# Altium footprint library RNG_Footprints.PcbLib: 134 footprints (part 5 of 9)
Each footprint in its own frame and in the unit in brackets; x right, y up, seen from the top. Pads: shape width x height; smd on the part's side, far side on the other; paste and mask are expansions set on the pad; w line width, h text height; cw(c..) or ccw(c..) is an arc to the next point about the centre after c.
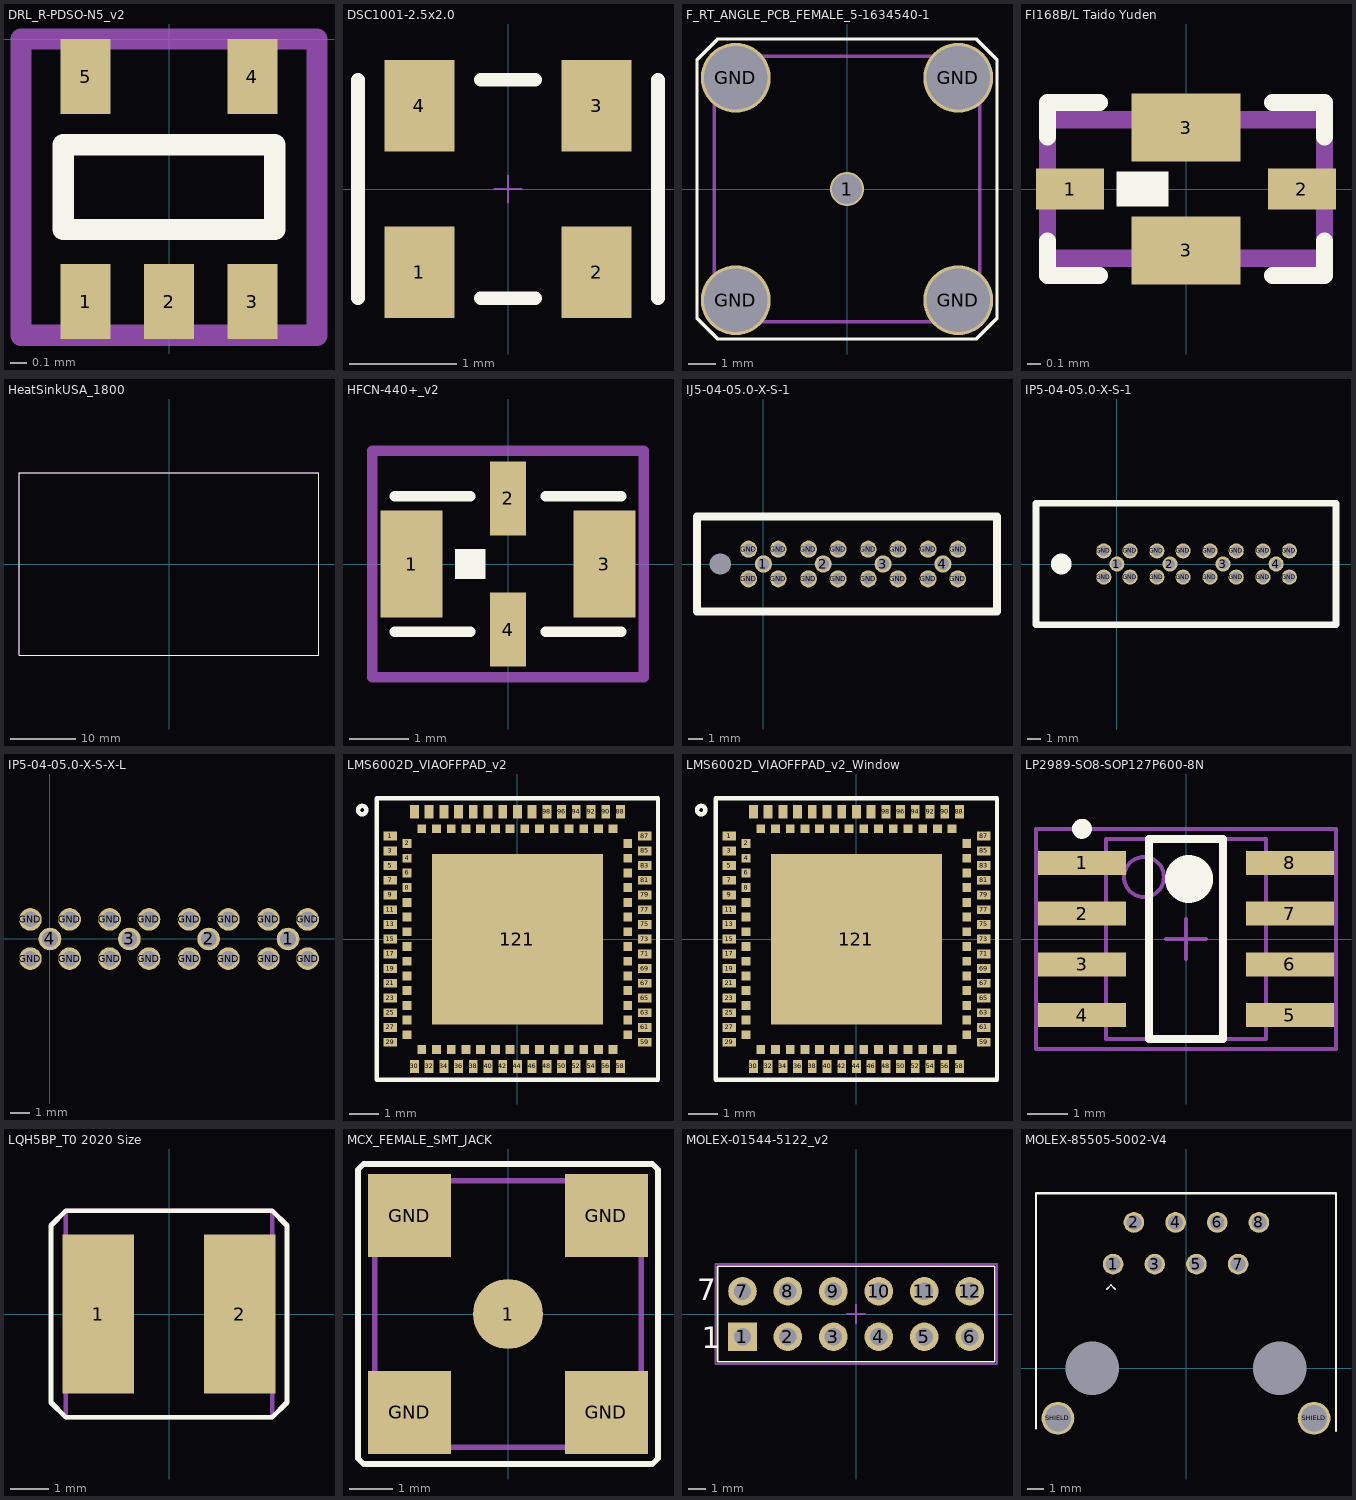
[diagram p4: the footprints below, top view; thin cyan lines are the x and y axes]

## DRL_R-PDSO-N5_v2 [mm] "SN74AUP1G06DRLR_SOT_Inverter"
height 0.6
pads (5):
  rect 0.3x0.45 smd mask+0.05: 1(-0.5,-1.575) 2(0,-1.575) 3(0.5,-1.575) 4(0.5,-0.225) 5(-0.5,-0.225)
Top Overlay:
  lines w0.127: -0.635,-1.143 -0.635,-0.635 0.635,-0.635 0.635,-1.143 -0.635,-1.143
  text "." at -0.889,-1.397 h0.5
Mechanical 15:
  lines w0.127: -0.889,-1.778 -0.889,0 0.889,0 0.889,-1.778 -0.889,-1.778
3D body: height 0.6, standoff 0, extent -0.85,-1.5 0.85,-0.2

## DSC1001-2.5x2.0 [mm] "Discera Low-Power Precision Oscillator 2.5x2.0 mm"
height 0.9
pads (4):
  rect 0.65x0.85 smd: 1(-0.825,-0.775) 2(0.825,-0.775) 3(0.825,0.775) 4(-0.825,0.775)
Top Overlay:
  lines w0.127: -1.397,-1.016 -1.397,1.016 ; -0.254,-1.016 0.254,-1.016 ; -0.254,1.016 0.254,1.016 ; 1.397,-1.016 1.397,1.016
  text "." at -1.27,-1.778 h1
Mechanical 15:
  lines w0.02: -0.127,0 0.127,0 ; 0,-0.127 0,0.127
3D body "User Library-VCXO 2_5x2_0.STEP": height 0.72, standoff 0.01, extent -1.25,-1 1.25,1

## F_RT_ANGLE_PCB_FEMALE_5-1634540-1 [mm] "TE Connectivity 5-1634540-1 F-Type PCB Female Rt-Angle Mount"
height 16
pads (5):
  round 1.245 hole 1.1 mask+0.05: 1(0,0)
  round 2.54 hole 2.3 mask+0.05: GND(-4.05,-4.05) GND(-4.05,4.05) GND(4.05,-4.05) GND(4.05,4.05)
Top Overlay:
  lines w0.127: -5.461,-4.699 -4.699,-5.461 4.699,-5.461 5.461,-4.699 5.461,4.699 4.699,5.461 -4.699,5.461 -5.461,4.699 -5.461,4.445 -5.461,-4.699
Mechanical 15:
  lines w0.127: -4.826,-4.826 -4.826,4.826 4.826,4.826 4.826,-4.826 -4.826,-4.826
3D body: height 13.1, standoff 0, extent -4.75,-4.75 4.75,4.75
3D body: height 12.31, standoff 2.85, extent 4.75,-4.741 23.25,4.741

## FI168B/L Taido Yuden [mm] "Taido Yuden Band- and Low-Pass Ceramic Filter for FI168 Type"
height 0.5
pads (4):
  rect 0.5x0.3 smd mask+0.038: 1(-0.85,0) 2(0.85,0)
  rect 0.8x0.5 smd mask+0.038: 3(0,-0.45) 3(0,0.45)
Top Overlay:
  rectangle: -0.508,-0.127 -0.127,0.127
  lines w0.127: -1.016,-0.381 -1.016,-0.635 -0.635,-0.635 ; -1.016,0.381 -1.016,0.635 -0.635,0.635 ; 0.635,-0.635 1.016,-0.635 1.016,-0.381 ; 0.635,0.635 1.016,0.635 1.016,0.381
Mechanical 15:
  lines w0.127: -1.016,-0.508 1.016,-0.508 1.016,0.508 -1.016,0.508 -1.016,-0.508
3D body: height 0.5, standoff 0, extent -0.85,-0.45 0.85,0.45

## HeatSinkUSA_1800 [mm] "HeatSinkUSA 1.8\" Heat Sink"
height 31.75
Top Overlay:
  lines w0.127: -23.114,-14.097 23.114,-14.097 23.114,14.097 -23.114,14.097 -23.114,-14.097
Mechanical 15:
  lines w0.127: -23.114,-14.097 23.114,-14.097 23.114,14.097 -23.114,14.097 -23.114,-14.097
3D body: height 31.75, standoff 0, extent -23.025,-13.97 23.025,13.97

## HFCN-440+_v2 [mil] "Mini-Circuits High-Pass 500-2500 MHz SMT High-Pass Filter"
height 37
pads (4):
  rect 41x71 smd: 1(-64,0) 3(64,0)
  rect 24x49 smd: 2(0,43.5) 4(0,-43.5)
Top Overlay:
  rectangle: -35,-10 -15,10
  lines w7: -75,-45 -25,-45 ; -75,45 -25,45 ; 25,-45 75,-45 ; 25,45 75,45
Mechanical 15:
  lines w7: -90,-75 90,-75 90,75 -90,75 -90,-75
3D body: height 37, standoff 0, extent -63,-31.5 63,31.5

## IJ5-04-05.0-X-S-1 [mil] "Samtec IJ5 50 Ohm High-Isolation RF Jack, 4-POS, Single Row"
height 296.06
pads (21):
  round 45 hole 31: 1(0,0) 2(157.5,0) 3(315,0) 4(472.5,0) GND(-39,-39) GND(-39,39) GND(39,-39) GND(39,39) GND(118.5,-39) GND(118.5,39) GND(196.5,-39) GND(196.5,39) GND(276,-39) GND(276,39) GND(354,-39) GND(354,39) GND(433.5,-39) GND(433.5,39) GND(511.5,-39) GND(511.5,39)
  round 0 hole 56 unplated: ""(-114,0)
Top Overlay:
  lines w20: -175,-125 -175,125 615,125 615,-125 -175,-125
3D body "IJ5-04-05.0-X-S-1.step": height 238.78, standoff -59.52, extent -163.99,-113.04 601.51,113.06

## IP5-04-05.0-X-S-1 [mil] "Samtec IP5 50 Ohm High Isolation RF Plugs, 4 Pos, Single Row"
height 358.1
pads (20):
  round 45 hole 31: 1(0,0) 2(157.5,0) 3(315,0) 4(472.5,0) GND(-39,-39) GND(-39,39) GND(39,-39) GND(39,39) GND(118.5,-39) GND(118.5,39) GND(196.5,-39) GND(196.5,39) GND(276,-39) GND(276,39) GND(354,-39) GND(354,39) GND(433.5,-39) GND(433.5,39) GND(511.5,-39) GND(511.5,39)
Top Overlay:
  circle w39.37: c-165,0 r11.18
  lines w20: -240,-180 650,-180 650,180 -240,180 -240,-180
3D body "IP5-04-05.0-X-S-1.step": height 358.78, standoff -59.52, extent -225,-168 635,168.05

## IP5-04-05.0-X-S-X-L [mil] "Samtec IP5 50 Ohm High Isolation RF Plugs, 4 Pos, Single Row, w/ Latch"
height 358.1
pads (20):
  round 45 hole 31: 1(472.5,0) 2(315,0) 3(157.5,0) 4(0,0) GND(-39,-39) GND(-39,39) GND(39,-39) GND(39,39) GND(118.5,-39) GND(118.5,39) GND(196.5,-39) GND(196.5,39) GND(276,-39) GND(276,39) GND(354,-39) GND(354,39) GND(433.5,-39) GND(433.5,39) GND(511.5,-39) GND(511.5,39)
3D body "IP5-04-05.0-X-S-X-L.step": height 358.78, standoff -61.53, extent -378.75,-168.05 791.25,168.05

## LMS6002D_VIAOFFPAD_v2 [mm] "Lime Microsystems Wideband Transceiver 300-3800MHz"
height 0.6
pads (117):
  rect 0.45x0.3 smd mask+0.05: 1(-4.325,3.5) 3(-4.325,3) 5(-4.325,2.5) 7(-4.325,2) 9(-4.325,1.5) 11(-4.325,1) 13(-4.325,0.5) 15(-4.325,0) 17(-4.325,-0.5) 19(-4.325,-1) 21(-4.325,-1.5) 23(-4.325,-2) 25(-4.325,-2.5) 27(-4.325,-3) 29(-4.325,-3.5) 59(4.325,-3.5) 61(4.325,-3) 63(4.325,-2.5) 65(4.325,-2) 67(4.325,-1.5) 69(4.325,-1) 71(4.325,-0.5) 73(4.325,0) 75(4.325,0.5) 77(4.325,1) 79(4.325,1.5) 81(4.325,2) 83(4.325,2.5) 85(4.325,3) 87(4.325,3.5)
  rect 0.3x0.3 smd mask+0.05: 2(-3.75,3.25) 4(-3.75,2.75) 6(-3.75,2.25) 8(-3.75,1.75) 10(-3.75,1.25) 12(-3.75,0.75) 14(-3.75,0.25) 16(-3.75,-0.25) 18(-3.75,-0.75) 20(-3.75,-1.25) 22(-3.75,-1.75) 24(-3.75,-2.25) 26(-3.75,-2.75) 28(-3.75,-3.25) 31(-3.25,-3.75) 33(-2.75,-3.75) 35(-2.25,-3.75) 37(-1.75,-3.75) 39(-1.25,-3.75) 41(-0.75,-3.75) 43(-0.25,-3.75) 45(0.25,-3.75) 47(0.75,-3.75) 49(1.25,-3.75) 51(1.75,-3.75) 53(2.25,-3.75) 55(2.75,-3.75) 57(3.25,-3.75) 60(3.75,-3.25) 62(3.75,-2.75) 64(3.75,-2.25) 66(3.75,-1.75) 68(3.75,-1.25) 70(3.75,-0.75) 72(3.75,-0.25) 74(3.75,0.25) 76(3.75,0.75) 78(3.75,1.25) 80(3.75,1.75) 82(3.75,2.25) 84(3.75,2.75) 86(3.75,3.25) 89(3.25,3.75) 91(2.75,3.75) 93(2.25,3.75) 95(1.75,3.75) 97(1.25,3.75) 99(0.75,3.75) 101(0.25,3.75) 103(-0.25,3.75) 105(-0.75,3.75) 107(-1.25,3.75) 109(-1.75,3.75) 111(-2.25,3.75) 113(-2.75,3.75) 115(-3.25,3.75)
  rect 0.3x0.45 smd mask+0.05: 30(-3.5,-4.325) 32(-3,-4.325) 34(-2.5,-4.325) 36(-2,-4.325) 38(-1.5,-4.325) 40(-1,-4.325) 42(-0.5,-4.325) 44(0,-4.325) 46(0.5,-4.325) 48(1,-4.325) 50(1.5,-4.325) 52(2,-4.325) 54(2.5,-4.325) 56(3,-4.325) 58(3.5,-4.325) 88(3.5,4.325) 90(3,4.325) 92(2.5,4.325) 94(2,4.325) 96(1.5,4.325) 98(1,4.325) 100(0.5,4.325) 102(0,4.325) 104(-0.5,4.325) 106(-1,4.325) 108(-1.5,4.325) 110(-2,4.325) 112(-2.5,4.325) 114(-3,4.325) 116(-3.5,4.325)
  rect 5.8x5.8 smd paste-6.8 mask+0.05: 121(0,0)
Top Overlay:
  circle w0.15: c-5.275,4.385 r0.141
  lines w0.15: -4.775,-4.775 4.775,-4.775 4.775,4.785 -4.775,4.785 -4.775,-4.775
Top Paste:
  rectangle: -2.735,-2.6 -2.435,-1.9
  rectangle: -2.265,-2.6 -1.965,-1.9
  rectangle: -1.795,-2.6 -1.495,-1.9
  rectangle: -1.325,-2.6 -1.025,-1.9
  rectangle: -0.855,-2.6 -0.555,-1.9
  rectangle: -0.385,-2.6 -0.085,-1.9
  rectangle: 0.085,-2.6 0.385,-1.9
  rectangle: 0.555,-2.6 0.855,-1.9
  rectangle: 1.025,-2.6 1.325,-1.9
  rectangle: 1.495,-2.6 1.795,-1.9
  rectangle: 1.965,-2.6 2.265,-1.9
  rectangle: 2.435,-2.6 2.735,-1.9
  rectangle: 2.435,-2.6 2.735,-1.9
  rectangle: 1.965,-2.6 2.265,-1.9
  rectangle: 1.495,-2.6 1.795,-1.9
  rectangle: 1.025,-2.6 1.325,-1.9
  rectangle: 0.555,-2.6 0.855,-1.9
  rectangle: 0.085,-2.6 0.385,-1.9
  rectangle: -0.385,-2.6 -0.085,-1.9
  rectangle: -0.855,-2.6 -0.555,-1.9
  rectangle: -1.325,-2.6 -1.025,-1.9
  rectangle: -1.795,-2.6 -1.495,-1.9
  rectangle: -2.265,-2.6 -1.965,-1.9
  rectangle: -2.735,-2.6 -2.435,-1.9
  rectangle: 2.435,-1.7 2.735,-1
  rectangle: 1.965,-1.7 2.265,-1
  rectangle: 1.495,-1.7 1.795,-1
  rectangle: 1.025,-1.7 1.325,-1
  rectangle: 0.555,-1.7 0.855,-1
  rectangle: 0.085,-1.7 0.385,-1
  rectangle: -0.385,-1.7 -0.085,-1
  rectangle: -0.855,-1.7 -0.555,-1
  rectangle: -1.325,-1.7 -1.025,-1
  rectangle: -1.795,-1.7 -1.495,-1
  rectangle: -2.265,-1.7 -1.965,-1
  rectangle: -2.735,-1.7 -2.435,-1
  rectangle: 2.435,-0.8 2.735,-0.1
  rectangle: 1.965,-0.8 2.265,-0.1
  rectangle: 1.495,-0.8 1.795,-0.1
  rectangle: 1.025,-0.8 1.325,-0.1
  rectangle: 0.555,-0.8 0.855,-0.1
  rectangle: 0.085,-0.8 0.385,-0.1
  rectangle: -0.385,-0.8 -0.085,-0.1
  rectangle: -0.855,-0.8 -0.555,-0.1
  rectangle: -1.325,-0.8 -1.025,-0.1
  rectangle: -1.795,-0.8 -1.495,-0.1
  rectangle: -2.265,-0.8 -1.965,-0.1
  rectangle: -2.735,-0.8 -2.435,-0.1
  rectangle: 2.435,0.1 2.735,0.8
  rectangle: 1.965,0.1 2.265,0.8
  rectangle: 1.495,0.1 1.795,0.8
  rectangle: 1.025,0.1 1.325,0.8
  rectangle: 0.555,0.1 0.855,0.8
  rectangle: 0.085,0.1 0.385,0.8
  rectangle: -0.385,0.1 -0.085,0.8
  rectangle: -0.855,0.1 -0.555,0.8
  rectangle: -1.325,0.1 -1.025,0.8
  rectangle: -1.795,0.1 -1.495,0.8
  rectangle: -2.265,0.1 -1.965,0.8
  rectangle: -2.735,0.1 -2.435,0.8
  rectangle: 2.435,1 2.735,1.7
  rectangle: 1.965,1 2.265,1.7
  rectangle: 1.495,1 1.795,1.7
  rectangle: 1.025,1 1.325,1.7
  rectangle: 0.555,1 0.855,1.7
  rectangle: 0.085,1 0.385,1.7
  rectangle: -0.385,1 -0.085,1.7
  rectangle: -0.855,1 -0.555,1.7
  rectangle: -1.325,1 -1.025,1.7
  rectangle: -1.795,1 -1.495,1.7
  rectangle: -2.265,1 -1.965,1.7
  rectangle: -2.735,1 -2.435,1.7
  rectangle: 2.435,1.9 2.735,2.6
  rectangle: 1.965,1.9 2.265,2.6
  rectangle: 1.495,1.9 1.795,2.6
  rectangle: 1.025,1.9 1.325,2.6
  rectangle: 0.555,1.9 0.855,2.6
  rectangle: 0.085,1.9 0.385,2.6
  rectangle: -0.385,1.9 -0.085,2.6
  rectangle: -0.855,1.9 -0.555,2.6
  rectangle: -1.325,1.9 -1.025,2.6
  rectangle: -1.795,1.9 -1.495,2.6
  rectangle: -2.265,1.9 -1.965,2.6
  rectangle: -2.735,1.9 -2.435,2.6
Bottom Solder:
  rectangle: -2.921,-2.921 2.921,2.921
3D body: height 0.6, standoff 0, extent -4.5,-4.5 4.5,4.5

## LMS6002D_VIAOFFPAD_v2_Window [mm] "Lime Microsystems Wideband Transceiver 300-3800MHz"
height 0.6
pads (117):
  rect 0.45x0.3 smd mask+0.05: 1(-4.325,3.5) 3(-4.325,3) 5(-4.325,2.5) 7(-4.325,2) 9(-4.325,1.5) 11(-4.325,1) 13(-4.325,0.5) 15(-4.325,0) 17(-4.325,-0.5) 19(-4.325,-1) 21(-4.325,-1.5) 23(-4.325,-2) 25(-4.325,-2.5) 27(-4.325,-3) 29(-4.325,-3.5) 59(4.325,-3.5) 61(4.325,-3) 63(4.325,-2.5) 65(4.325,-2) 67(4.325,-1.5) 69(4.325,-1) 71(4.325,-0.5) 73(4.325,0) 75(4.325,0.5) 77(4.325,1) 79(4.325,1.5) 81(4.325,2) 83(4.325,2.5) 85(4.325,3) 87(4.325,3.5)
  rect 0.3x0.3 smd mask+0.05: 2(-3.75,3.25) 4(-3.75,2.75) 6(-3.75,2.25) 8(-3.75,1.75) 10(-3.75,1.25) 12(-3.75,0.75) 14(-3.75,0.25) 16(-3.75,-0.25) 18(-3.75,-0.75) 20(-3.75,-1.25) 22(-3.75,-1.75) 24(-3.75,-2.25) 26(-3.75,-2.75) 28(-3.75,-3.25) 31(-3.25,-3.75) 33(-2.75,-3.75) 35(-2.25,-3.75) 37(-1.75,-3.75) 39(-1.25,-3.75) 41(-0.75,-3.75) 43(-0.25,-3.75) 45(0.25,-3.75) 47(0.75,-3.75) 49(1.25,-3.75) 51(1.75,-3.75) 53(2.25,-3.75) 55(2.75,-3.75) 57(3.25,-3.75) 60(3.75,-3.25) 62(3.75,-2.75) 64(3.75,-2.25) 66(3.75,-1.75) 68(3.75,-1.25) 70(3.75,-0.75) 72(3.75,-0.25) 74(3.75,0.25) 76(3.75,0.75) 78(3.75,1.25) 80(3.75,1.75) 82(3.75,2.25) 84(3.75,2.75) 86(3.75,3.25) 89(3.25,3.75) 91(2.75,3.75) 93(2.25,3.75) 95(1.75,3.75) 97(1.25,3.75) 99(0.75,3.75) 101(0.25,3.75) 103(-0.25,3.75) 105(-0.75,3.75) 107(-1.25,3.75) 109(-1.75,3.75) 111(-2.25,3.75) 113(-2.75,3.75) 115(-3.25,3.75)
  rect 0.3x0.45 smd mask+0.05: 30(-3.5,-4.325) 32(-3,-4.325) 34(-2.5,-4.325) 36(-2,-4.325) 38(-1.5,-4.325) 40(-1,-4.325) 42(-0.5,-4.325) 44(0,-4.325) 46(0.5,-4.325) 48(1,-4.325) 50(1.5,-4.325) 52(2,-4.325) 54(2.5,-4.325) 56(3,-4.325) 58(3.5,-4.325) 88(3.5,4.325) 90(3,4.325) 92(2.5,4.325) 94(2,4.325) 96(1.5,4.325) 98(1,4.325) 100(0.5,4.325) 102(0,4.325) 104(-0.5,4.325) 106(-1,4.325) 108(-1.5,4.325) 110(-2,4.325) 112(-2.5,4.325) 114(-3,4.325) 116(-3.5,4.325)
  rect 5.8x5.8 smd paste-6.8 mask-6.8: 121(0,0)
Top Overlay:
  circle w0.15: c-5.275,4.385 r0.141
  lines w0.15: -4.775,-4.775 -4.775,4.785 4.775,4.785 4.775,-4.775 -4.775,-4.775
Top Paste:
  rectangle: -2.735,1.9 -2.435,2.6
  rectangle: -2.265,1.9 -1.965,2.6
  rectangle: -1.795,1.9 -1.495,2.6
  rectangle: -1.325,1.9 -1.025,2.6
  rectangle: -0.855,1.9 -0.555,2.6
  rectangle: -0.385,1.9 -0.085,2.6
  rectangle: 0.085,1.9 0.385,2.6
  rectangle: 0.555,1.9 0.855,2.6
  rectangle: 1.025,1.9 1.325,2.6
  rectangle: 1.495,1.9 1.795,2.6
  rectangle: 1.965,1.9 2.265,2.6
  rectangle: 2.435,1.9 2.735,2.6
  rectangle: -2.735,1 -2.435,1.7
  rectangle: -2.265,1 -1.965,1.7
  rectangle: -1.795,1 -1.495,1.7
  rectangle: -1.325,1 -1.025,1.7
  rectangle: -0.855,1 -0.555,1.7
  rectangle: -0.385,1 -0.085,1.7
  rectangle: 0.085,1 0.385,1.7
  rectangle: 0.555,1 0.855,1.7
  rectangle: 1.025,1 1.325,1.7
  rectangle: 1.495,1 1.795,1.7
  rectangle: 1.965,1 2.265,1.7
  rectangle: 2.435,1 2.735,1.7
  rectangle: -2.735,0.1 -2.435,0.8
  rectangle: -2.265,0.1 -1.965,0.8
  rectangle: -1.795,0.1 -1.495,0.8
  rectangle: -1.325,0.1 -1.025,0.8
  rectangle: -0.855,0.1 -0.555,0.8
  rectangle: -0.385,0.1 -0.085,0.8
  rectangle: 0.085,0.1 0.385,0.8
  rectangle: 0.555,0.1 0.855,0.8
  rectangle: 1.025,0.1 1.325,0.8
  rectangle: 1.495,0.1 1.795,0.8
  rectangle: 1.965,0.1 2.265,0.8
  rectangle: 2.435,0.1 2.735,0.8
  rectangle: -2.735,-0.8 -2.435,-0.1
  rectangle: -2.265,-0.8 -1.965,-0.1
  rectangle: -1.795,-0.8 -1.495,-0.1
  rectangle: -1.325,-0.8 -1.025,-0.1
  rectangle: -0.855,-0.8 -0.555,-0.1
  rectangle: -0.385,-0.8 -0.085,-0.1
  rectangle: 0.085,-0.8 0.385,-0.1
  rectangle: 0.555,-0.8 0.855,-0.1
  rectangle: 1.025,-0.8 1.325,-0.1
  rectangle: 1.495,-0.8 1.795,-0.1
  rectangle: 1.965,-0.8 2.265,-0.1
  rectangle: 2.435,-0.8 2.735,-0.1
  rectangle: -2.735,-1.7 -2.435,-1
  rectangle: -2.265,-1.7 -1.965,-1
  rectangle: -1.795,-1.7 -1.495,-1
  rectangle: -1.325,-1.7 -1.025,-1
  rectangle: -0.855,-1.7 -0.555,-1
  rectangle: -0.385,-1.7 -0.085,-1
  rectangle: 0.085,-1.7 0.385,-1
  rectangle: 0.555,-1.7 0.855,-1
  rectangle: 1.025,-1.7 1.325,-1
  rectangle: 1.495,-1.7 1.795,-1
  rectangle: 1.965,-1.7 2.265,-1
  rectangle: 2.435,-1.7 2.735,-1
  rectangle: -2.735,-2.6 -2.435,-1.9
  rectangle: -2.265,-2.6 -1.965,-1.9
  rectangle: -1.795,-2.6 -1.495,-1.9
  rectangle: -1.325,-2.6 -1.025,-1.9
  rectangle: -0.855,-2.6 -0.555,-1.9
  rectangle: -0.385,-2.6 -0.085,-1.9
  rectangle: 0.085,-2.6 0.385,-1.9
  rectangle: 0.555,-2.6 0.855,-1.9
  rectangle: 1.025,-2.6 1.325,-1.9
  rectangle: 1.495,-2.6 1.795,-1.9
  rectangle: 1.965,-2.6 2.265,-1.9
  rectangle: 2.435,-2.6 2.735,-1.9
  rectangle: 2.435,-2.6 2.735,-1.9
  rectangle: 1.965,-2.6 2.265,-1.9
  rectangle: 1.495,-2.6 1.795,-1.9
  rectangle: 1.025,-2.6 1.325,-1.9
  rectangle: 0.555,-2.6 0.855,-1.9
  rectangle: 0.085,-2.6 0.385,-1.9
  rectangle: -0.385,-2.6 -0.085,-1.9
  rectangle: -0.855,-2.6 -0.555,-1.9
  rectangle: -1.325,-2.6 -1.025,-1.9
  rectangle: -1.795,-2.6 -1.495,-1.9
  rectangle: -2.265,-2.6 -1.965,-1.9
  rectangle: -2.735,-2.6 -2.435,-1.9
Top Solder:
  rectangle: 0.051,-2.95 2.95,-0.051
  rectangle: -2.95,-2.95 -0.051,-0.051
  rectangle: -2.95,0.051 -0.051,2.95
  rectangle: 0.051,0.051 2.95,2.95
Bottom Solder:
  rectangle: -2.921,-2.921 2.921,2.921
3D body: height 0.6, standoff 0, extent -4.5,-4.5 4.5,4.5

## LP2989-SO8-SOP127P600-8N [mm] "LP2989 SO-8 Land Pattern"
height 1.75
pads (8):
  rect 2.2x0.6 smd: 1(-2.6,1.905) 2(-2.6,0.635) 3(-2.6,-0.635) 4(-2.6,-1.905) 5(2.6,-1.905) 6(2.6,-0.635) 7(2.6,0.635) 8(2.6,1.905)
Top Overlay:
  circle w0.6: c0.075,1.5 r0.3
  circle w0.25: c-2.6,2.755 r0.125
  lines w0.2: -0.925,-2.5 0.925,-2.5 0.925,2.5 -0.925,2.5 -0.925,-2.5
Mechanical 13:
  circle w0.1: c-1.05,1.55 r0.5
  lines w0.1: -2,-2.5 2,-2.5 2,2.5 -2,2.5 -2,-2.5
Mechanical 15:
  lines w0.1: -0.5,0 0.5,0 ; 0,-0.5 0,0.5 ; -3.75,-2.75 3.75,-2.75 3.75,2.75 -3.75,2.75 -3.75,-2.75
3D body: height 1.75, standoff 0.1, extent -2,-2.5 2,2.5

## LQH5BP_T0 2020 Size [mm] "2020 Size for Murata LQH5BP_T0 Series Power Inductors"
height 2.2
pads (2):
  rect 1.85x4.1 smd: 1(-1.825,0) 2(1.825,0)
Top Overlay:
  lines w0.127: -2.667,2.667 2.667,2.667 ; -2.667,2.667 -3.048,2.286 -3.048,-2.286 -2.667,-2.667 2.667,-2.667 3.048,-2.286 3.048,2.286 2.667,2.667 ; -2.667,2.667 2.667,2.667
Mechanical 15:
  lines w0.127: -2.667,-2.667 2.667,-2.667 2.667,2.667 -2.667,2.667 -2.667,-2.667
3D body: height 2.2, standoff 0, extent -2.6,-2.6 2.6,2.6

## MCX_FEMALE_SMT_JACK [mm] "Molex 73415-1691 MCX 50 Ohm Female SMT Jack"
height 5.9
pads (5):
  round 1.6 smd: 1(0,0)
  rect 1.9x1.9 smd: GND(-2.25,-2.25) GND(-2.25,2.25) GND(2.25,-2.25) GND(2.25,2.25)
Top Overlay:
  lines w0.127: -3.429,-3.302 -3.429,3.302 -3.302,3.429 3.302,3.429 3.429,3.302 3.429,-3.302 3.302,-3.429 -3.302,-3.429 -3.429,-3.302
Mechanical 15:
  lines w0.127: -3.048,-3.048 -3.048,0.635 -3.048,3.048 3.048,3.048 3.048,-3.048 -3.048,-3.048
3D body: height 5.9, standoff 0, extent -2.232,-2.245 2.25,2.246
3D body: height 1.4, standoff 0, extent -2.95,-2.95 2.95,2.95

## MOLEX-01544-5122_v2 [mm] "Molex 2x6 2.54mm Striaght Thru Receptacle for PMOD"
height 8.64
pads (12):
  rect 1.6x1.6 hole 0.97: 1(-6.35,-1.27)
  round 1.6 hole 0.97: 2(-3.81,-1.27) 3(-1.27,-1.27) 4(1.27,-1.27) 5(3.81,-1.27) 6(6.35,-1.27) 7(-6.35,1.27) 8(-3.81,1.27) 9(-1.27,1.27) 10(1.27,1.27) 11(3.81,1.27) 12(6.35,1.27)
Top Overlay:
  lines w0.1: -7.747,-2.667 7.747,-2.667 7.747,2.667 -7.747,2.667 -7.747,-2.667
  text "7" at -8.89,0.762 h1.2
  text "1" at -8.636,-1.905 h1.2
Mechanical 15:
  lines w0.1: -0.508,0 0.508,0 ; 0,-0.508 0,0.508 ; -7.874,-2.794 7.874,-2.794 7.874,2.794 -7.874,2.794 -7.874,-2.794
3D body "015445112.stp": height 8.65, standoff -3.04, extent -7.607,-2.527 7.608,2.527

## MOLEX-85505-5002-V4 [mm] "RJ-45 Modular Jack, Thru Rt Angle, Cat 5e"
height 13
pads (12):
  round 1.256 hole 0.9: 1(-4.445,6.35) 2(-3.175,8.89) 3(-1.905,6.35) 4(-0.635,8.89) 5(0.635,6.35) 6(1.905,8.89) 7(3.175,6.35) 8(4.445,8.89)
  round 2 hole 1.6: SHIELD(-7.805,-3.05) SHIELD(7.805,-3.05)
  round 0 hole 3.25 unplated: ""(-5.715,0) ""(5.715,0)
Top Overlay:
  lines w0.1: -4.826,4.826 -4.572,5.08 -4.318,4.826
  lines w0.127: -9.144,-3.683 -9.144,10.668 9.144,10.668 9.144,-3.81
3D body "855055002.stp": height 13.01, standoff -3.29, extent -9.95,-8.28 9.95,10.52